# Altium footprint library Connectors.PcbLib: 155 footprints (part 4 of 10)
Each footprint in its own frame and in the unit in brackets; x right, y up, seen from the top. Pads: shape width x height; smd on the part's side, far side on the other; paste and mask are expansions set on the pad; w line width, h text height; cw(c..) or ccw(c..) is an arc to the next point about the centre after c.
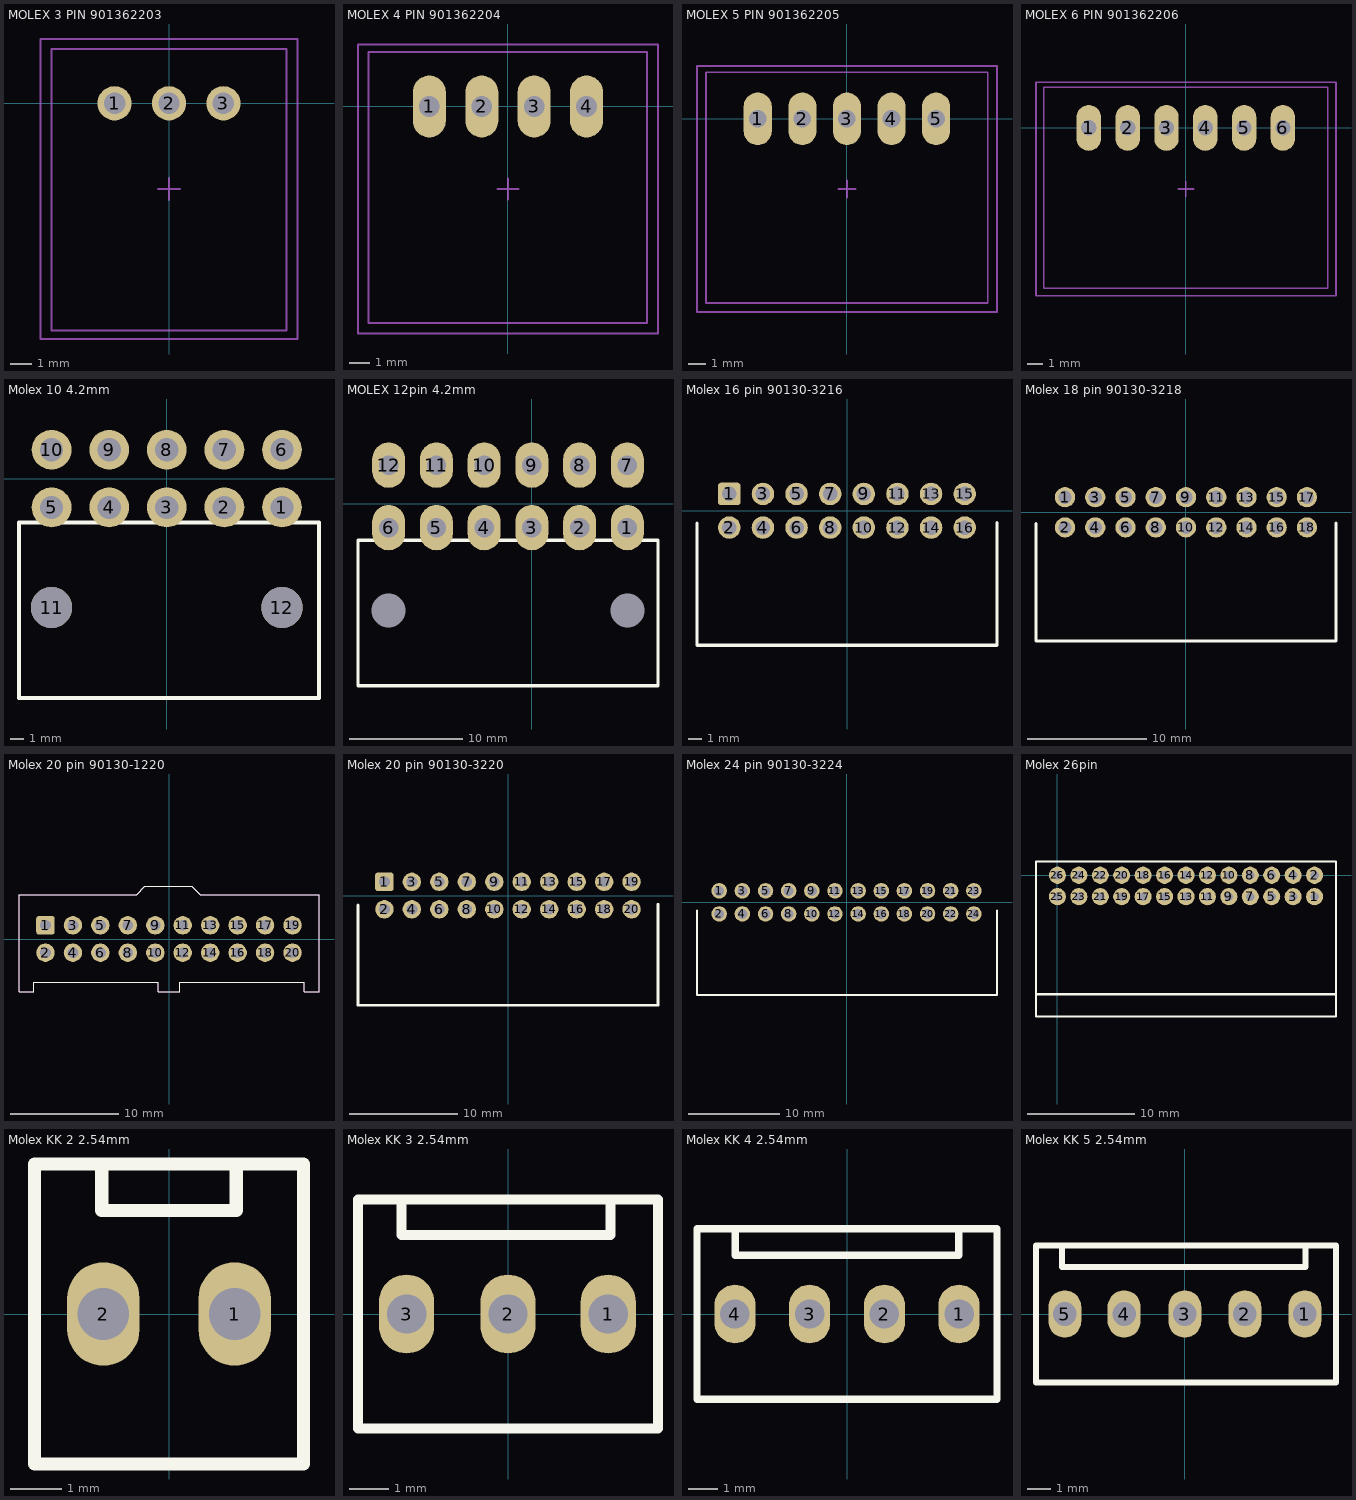
[diagram p3: the footprints below, top view; thin cyan lines are the x and y axes]

## MOLEX 3 PIN 901362203 [mm] "90136-2203 C-Grid III, Single row, 3 pins, Right angle"
height 7.21
pads (3):
  round 1.6 hole 1: 1(-2.54,0) 2(0,0) 3(2.54,0)
Mechanical 13:
  lines w0.1: -5.485,-10.6 5.485,-10.6 5.485,2.54 -5.485,2.54 -5.485,-10.6
Mechanical 15:
  lines w0.1: -0.5,-4 0.5,-4 ; 0,-4.5 0,-3.5 ; -6,-11 6,-11 6,3 -6,3 -6,-11
3D body: height 7.2, standoff -2.91, extent -5.485,-10.6 5.485,2.54

## MOLEX 4 PIN 901362204 [mm] "90136-2204 C-Grid III, Single row, 4 pins, Right angle"
height 7.21
pads (4):
  oval 1.6x3 hole 1: 1(-3.81,0) 2(-1.27,0) 3(1.27,0) 4(3.81,0)
Mechanical 13:
  lines w0.1: -6.755,-10.5 6.75,-10.5 6.75,2.65 -6.755,2.65 -6.755,-10.5
Mechanical 15:
  lines w0.1: -0.5,-4 0.5,-4 ; 0,-4.5 0,-3.5 ; -7.27,-11 7.275,-11 7.275,3 -7.27,3 -7.27,-11
3D body: height 7.2, standoff -2.91, extent -6.755,-10.49 6.755,2.65

## MOLEX 5 PIN 901362205 [mm] "90136-2205 C-Grid III, Single row, 5 pins, Right angle"
height 7.21
pads (5):
  oval 1.6x3 hole 1: 1(-5.08,0) 2(-2.54,0) 3(0,0) 4(2.54,0) 5(5.08,0)
Mechanical 13:
  lines w0.1: -8.025,-10.5 -8.025,2.65 8.025,2.65 8.025,-10.5 -8.025,-10.5
Mechanical 15:
  lines w0.1: -0.5,-4 0.5,-4 ; 0,-4.5 0,-3.5 ; -8.54,-11 -8.54,3 8.55,3 8.55,-11 -8.54,-11
3D body: height 7.2, standoff -2.91, extent -8.025,-10.5 8.025,2.64

## MOLEX 6 PIN 901362206 [mm] "90136-2206 C-Grid III, Single row, 6 pins, Right angle"
height 7.21
pads (6):
  oval 1.6x3 hole 1: 1(-6.35,0) 2(-3.81,0) 3(-1.27,0) 4(1.27,0) 5(3.81,0) 6(6.35,0)
Mechanical 13:
  lines w0.1: -9.295,-10.5 -9.295,2.65 9.3,2.65 9.3,-10.5 -9.295,-10.5
Mechanical 15:
  lines w0.1: -0.5,-4 0.5,-4 ; 0,-4.5 0,-3.5 ; -9.81,-11 -9.81,3 9.825,3 9.825,-11 -9.81,-11
3D body: height 7.2, standoff -2.91, extent -9.295,-10.49 9.295,2.65

## Molex 10 4.2mm [mm] "Right angle molex header"
pads (12):
  round 2.9 hole 1.7: 1(8.4,-2.1) 2(4.2,-2.1) 3(0,-2.1) 4(-4.2,-2.1) 5(-8.4,-2.1) 6(8.4,2.1) 7(4.2,2.1) 8(0,2.1) 9(-4.2,2.1) 10(-8.4,2.1)
  round 3 hole 3: 11(-8.4,-9.4) 12(8.4,-9.4)
Top Overlay:
  lines w0.3: -8.4,-3.2 8.4,-3.2 11.1,-3.2 11.1,-12.075 11.1,-16 8.4,-16 -1.075,-16 -8.4,-16 -10.775,-16 -10.775,-7.05 -10.775,-3.2 -6.875,-3.2 ; -8.4,-9.4 -8.4,-9.4
3D body: height 9.6, standoff 0, extent -10.925,-16.15 11.25,-3.05

## MOLEX 12pin 4.2mm [mm]
pads (14):
  oval 2.9x4 hole 1.7: 1(8.4,-2.1) 2(4.2,-2.1) 3(0,-2.1) 4(-4.2,-2.1) 5(-8.4,-2.1) 6(-12.6,-2.1) 7(8.4,3.4) 8(4.2,3.4) 9(0,3.4) 10(-4.2,3.4) 11(-8.4,3.4) 12(-12.6,3.4)
  round 0 hole 3: 13(-12.6,-9.4) 14(8.4,-9.4)
Top Overlay:
  lines w0.3: -8.4,-3.2 8.4,-3.2 11.1,-3.2 11.1,-12.075 11.1,-16 8.4,-16 -1.075,-16 -8.4,-16 -10.775,-16 -15.3,-16 -15.3,-3.2 -10.775,-3.2 -6.875,-3.2
3D body: height 11.4, standoff -3.6, extent -15.475,-16.025 11.325,3.91

## Molex 16 pin 90130-3216 [mm] "Molex 16 pin 90130-3216"
height 10
pads (16):
  rrect25% 1.7x1.7 hole 1.1: 1(-8.89,1.27)
  round 1.7 hole 1.1: 2(-8.89,-1.27) 3(-6.35,1.27) 4(-6.35,-1.27) 5(-3.81,1.27) 6(-3.81,-1.27) 7(-1.27,1.27) 8(-1.27,-1.27) 9(1.27,1.27) 10(1.27,-1.27) 11(3.81,1.27) 12(3.81,-1.27) 13(6.35,1.27) 14(6.35,-1.27) 15(8.89,1.27) 16(8.89,-1.27)
Top Overlay:
  lines w0.254: -11.328,-0.925 -11.328,-10.16 11.328,-10.16 11.328,-0.9
3D body: height 9.74, standoff -2.91, extent -11.33,-11.8 11.33,1.603

## Molex 18 pin 90130-3218 [mm] "Molex 18 pin 90130-3218"
height 10
pads (18):
  round 1.7 hole 1.1: 1(-10.16,1.27) 2(-10.16,-1.27) 3(-7.62,1.27) 4(-7.62,-1.27) 5(-5.08,1.27) 6(-5.08,-1.27) 7(-2.54,1.27) 8(-2.54,-1.27) 9(0,1.27) 10(0,-1.27) 11(2.54,1.27) 12(2.54,-1.27) 13(5.08,1.27) 14(5.08,-1.27) 15(7.62,1.27) 16(7.62,-1.27) 17(10.16,1.27) 18(10.16,-1.27)
Top Overlay:
  lines w0.254: -12.598,-0.925 -12.598,-10.8 12.6,-10.8 12.6,-0.9
3D body: height 9.77, standoff -2.88, extent -12.6,-11.8 12.6,1.603

## Molex 20 pin 90130-1220 [mm] "Molex 20 pin 90130-1220"
height 10.9
pads (20):
  rrect25% 1.7x1.7 hole 1: 1(-11.43,1.27)
  round 1.7 hole 1: 2(-11.43,-1.27) 3(-8.89,1.27) 4(-8.89,-1.27) 5(-6.35,1.27) 6(-6.35,-1.27) 7(-3.81,1.27) 8(-3.81,-1.27) 9(-1.27,1.27) 10(-1.27,-1.27) 11(1.27,1.27) 12(1.27,-1.27) 13(3.81,1.27) 14(3.81,-1.27) 15(6.35,1.27) 16(6.35,-1.27) 17(8.89,1.27) 18(8.89,-1.27) 19(11.43,1.27) 20(11.43,-1.27)
Top Overlay:
  lines w0.1: -13.875,-4.875 -12.5,-4.875 -12.5,-4 -1,-4 -1,-4.875 1,-4.875 1,-4 12.5,-4 12.5,-4.875 13.875,-4.875 13.875,4.1 2.9,4.1 2.125,4.875 -2.225,4.875 -3,4.1 -3.9,4.1 -13.875,4.1 -13.875,-4.875
Mechanical 13:
  lines w0.1: -13.875,-4.875 -12.5,-4.875 -12.5,-4 -1,-4 -1,-4.875 1,-4.875 1,-4 12.5,-4 12.5,-4.875 13.875,-4.875 13.875,4.1 2.9,4.1 2.125,4.875 -2.225,4.875 -3,4.1 -3.9,4.1 -13.875,4.1 -13.875,-4.875
3D body: height 10.95, standoff -2.85, extent -13.87,-4.875 13.87,4.875

## Molex 20 pin 90130-3220 [mm] "Molex 20 pin 90130-3220"
height 10
pads (20):
  rrect25% 1.7x1.7 hole 1: 1(-11.43,1.27)
  round 1.7 hole 1: 2(-11.43,-1.27) 3(-8.89,1.27) 4(-8.89,-1.27) 5(-6.35,1.27) 6(-6.35,-1.27) 7(-3.81,1.27) 8(-3.81,-1.27) 9(-1.27,1.27) 10(-1.27,-1.27) 11(1.27,1.27) 12(1.27,-1.27) 13(3.81,1.27) 14(3.81,-1.27) 15(6.35,1.27) 16(6.35,-1.27) 17(8.89,1.27) 18(8.89,-1.27) 19(11.43,1.27) 20(11.43,-1.27)
Top Overlay:
  lines w0.254: -13.868,-0.875 -13.868,-10.15 13.868,-10.15 13.868,-0.8
3D body: height 9.74, standoff -2.91, extent -13.87,-11.8 13.87,1.603

## Molex 24 pin 90130-3224 [mm] "Molex 24 pin 90130-3224"
height 10
pads (24):
  round 1.7 hole 1.1: 1(-13.97,1.27) 2(-13.97,-1.27) 3(-11.43,1.27) 4(-11.43,-1.27) 5(-8.89,1.27) 6(-8.89,-1.27) 7(-6.35,1.27) 8(-6.35,-1.27) 9(-3.81,1.27) 10(-3.81,-1.27) 11(-1.27,1.27) 12(-1.27,-1.27) 13(1.27,1.27) 14(1.27,-1.27) 15(3.81,1.27) 16(3.81,-1.27) 17(6.35,1.27) 18(6.35,-1.27) 19(8.89,1.27) 20(8.89,-1.27) 21(11.43,1.27) 22(11.43,-1.27) 23(13.97,1.27) 24(13.97,-1.27)
Top Overlay:
  lines w0.254: -16.408,-0.9 -16.408,-10.16 16.51,-10.16 16.51,-0.9
3D body: height 9.77, standoff -2.88, extent -16.41,-11.8 16.41,1.603

## Molex 26pin [mm] "iGrid 2mm 26pin"
pads (26):
  round 1.6 hole 0.8: 1(24,-2) 2(24,0) 3(22,-2) 4(22,0) 5(20,-2) 6(20,0) 7(18,-2) 8(18,0) 9(16,-2) 10(16,0) 11(14,-2) 12(14,0) 13(12,-2) 14(12,0) 15(10,-2) 16(10,0) 17(8,-2) 18(8,0) 19(6,-2) 20(6,0) 21(4,-2) 22(4,0) 23(2,-2) 24(2,0) 25(0,-2) 26(0,0)
Top Overlay:
  lines w0.2: -2,-13.2 -2,-11.1 26,-11.1 26,-13.2 ; -2,-13.2 -2,-12.65 -2,-2 -2,1.3 0,1.3 24,1.3 26,1.3 26,-2 26,-13.2 ; -2,-13.2 0,-13.2 24,-13.2 26,-13.2
3D body: height 8.4, standoff -3.1, extent -2.075,-13.225 25.925,1.275

## Molex KK 2 2.54mm [mm] "Molex KK 2 2.54mm"
height 11.7
pads (2):
  oval 1.4x2 hole 1: 1(1.27,0) 2(-1.27,0)
Top Overlay:
  lines w0.254: -1.3,2.9 -1.3,2 1.3,2 1.3,2.9 ; -2.6,-2.9 2.6,-2.9 2.6,2.9 -2.6,2.9 -2.6,-2.9
3D body: height 11.72, standoff -3.54, extent -2.54,-2.9 2.54,2.9

## Molex KK 3 2.54mm [mm] "Molex KK 3 2.54mm"
height 11.7
pads (3):
  oval 1.4x2 hole 1: 1(2.54,0) 2(0,0) 3(-2.57,0)
Top Overlay:
  lines w0.254: -2.7,2.9 -2.7,2 2.6,2 2.6,2.9 ; -3.8,-2.9 3.8,-2.9 3.8,2.9 -3.8,2.9 -3.8,-2.9
3D body: height 11.72, standoff -3.54, extent -3.8,-2.9 3.82,2.9

## Molex KK 4 2.54mm [mm] "Molex KK 4 2.54mm"
height 11.7
pads (4):
  oval 1.4x2 hole 1: 1(3.81,0) 2(1.27,0) 3(-1.27,0) 4(-3.81,0)
Top Overlay:
  lines w0.254: -3.8,2.9 -3.8,2 3.8,2 3.8,2.9 ; -5.1,-2.9 5.1,-2.9 5.1,2.9 -5.1,2.9 -5.1,-2.9
3D body: height 11.72, standoff -3.54, extent -5.06,-2.9 5.1,2.9

## Molex KK 5 2.54mm [mm] "Molex KK 5 2.54mm"
height 11.7
pads (5):
  oval 1.4x2 hole 1: 1(5.08,0) 2(2.54,0) 3(0,0) 4(-2.57,0) 5(-5.08,0)
Top Overlay:
  lines w0.254: -5.2,2.9 -5.2,2 5.1,2 5.1,2.9 ; -6.3,-2.9 -6.3,2.9 6.4,2.9 6.4,-2.9 -6.3,-2.9
3D body: height 11.72, standoff -3.54, extent -6.35,-2.9 6.35,2.9